# Altium schematic symbol library LATTICEPLDS_Library.SchLib: 291 symbols (part 5 of 32)
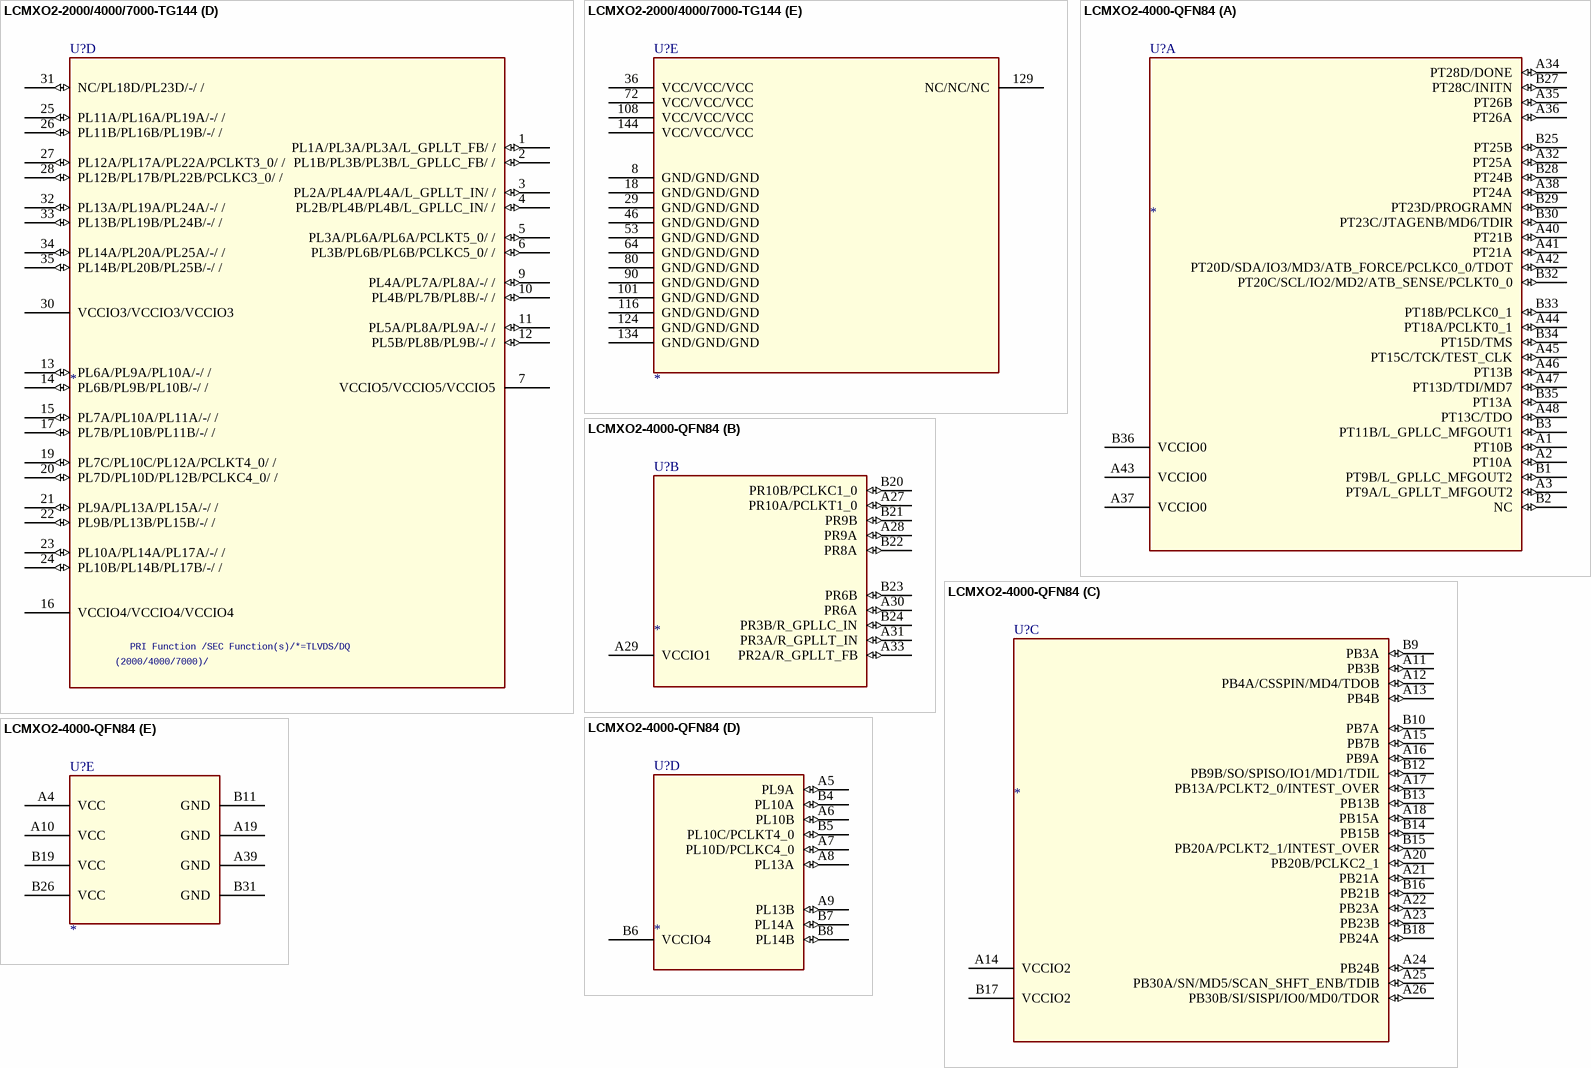
[diagram p307: symbols LCMXO2-2000/4000/7000-TG144 to LCMXO2-4000-QFN84]

## LCMXO2-2000/4000/7000-TG144
designator U?
SPLIT_INST: TRUE; SWAP_INFO: (S1+S2+S3+S4+S5)
part A pins: 109 PT24D/PT28D/PT36D/DONE/ / (io), 110 PT24C/PT28C/PT36C/INITN/ / (io), 111 PT23B/PT27B/PT35B/-/*/ (io), 112 PT23A/PT27A/PT35A/-/*/ (io), 113 PT22B/PT25B/PT33B/-/*/ (io), 114 PT22A/PT25A/PT33A/-/*/ (io), 115 PT21B/PT24B/PT28B/-/*/ (io), 117 PT21A/PT24A/PT28A/-/*/ (io), 118 VCCIO0/VCCIO0/VCCIO0 (power), 119 PT20D/PT23D/PT27D/PROGRAMN/ / (io), 120 PT20C/PT23C/PT27C/JTAGENB;MD6;TDIR/ / (io), 121 PT19B/PT21B/PT25B/-/*/ (io), 122 PT19A/PT21A/PT25A/-/*/ (io), 123 VCCIO0/VCCIO0/VCCIO0 (power), 125 PT18D/PT20D/PT22D/SDA;IO3;MD3;ATB_FORCE;PCLKC0_0;TDOT/ / (io), 126 PT18C/PT20C/PT22C/SCL;IO2;MD2;ATB_SENSE;PCLKT0_0/ / (io), 127 PT17B/PT18B/PT18B/PCLKC0_1/*/ (io), 128 PT17A/PT18A/PT18A/PCLKT0_1/*/ (io), 130 PT16D/PT15D/PT17D/TMS/ / (io), 131 PT16C/PT15C/PT17C/TCK;TEST_CLK/ / (io), 132 PT13B/PT14B/PT15B/-/*/ (io), 133 PT13A/PT14A/PT15A/-/*/ (io), 135 VCCIO0/VCCIO0/VCCIO0 (power), 136 PT12D/PT13D/PT14D/TDI;MD7/ / (io), 137 PT12C/PT13C/PT14C/TDO/ / (io), 138 PT11B/PT11B/PT11B/-/*/ (io), 139 PT11A/PT11A/PT11A/-/*/ (io), 140 PT10B/PT10B/PT10B/-/*/ (io), 141 PT10A/PT10A/PT10A/-/*/ (io), 142 PT9B/PT9B/PT9B/-/*/ (io), 143 PT9A/PT9A/PT9A/-/*/ (io)
part B pins: 73 PR14B/PR19B/PR24B/-/ /DQ1 (io), 74 PR14A/PR19A/PR24A/-/ /DQ1 (io), 75 PR13B/PR18B/PR23B/-/ /DQ1 (io), 76 PR13A/PR18A/PR23A/-/ /DQ1 (io), 77 PR12B/PR16B/PR21B/-/ /DQ1 (io), 78 PR12A/PR16A/PR21A/-/ /DQ1 (io), 79 VCCIO1/VCCIO1/VCCIO1 (power), 81 PR11B/PR15B/PR18B/-/ /DQ1 (io), 82 PR11A/PR15A/PR18A/-/ /DQ1 (io), 83 PR10B/PR14B/PR17B/-/ /DQ1 (io), 84 PR10A/PR14A/PR17A/-/ /DQ1 (io), 85 PR9B/PR13B/PR16B/-/ /DQS1N (io), 86 PR9A/PR13A/PR16A/-/ /DQS1 (io), 87 PR7D/PR10D/PR15B/-/ / (io), 88 VCCIO1/VCCIO1/VCCIO1 (power), 89 PR7C/PR10C/PR15A/-/ / (io), 91 PR7B/PR10B/PR12B/PCLKC1_0/ /DQ0 (io), 92 PR7A/PR10A/PR12A/PCLKT1_0/ /DQ0 (io), 93 PR6B/PR9B/PR11B/-/ /DQS0N (io), 94 PR6A/PR9A/PR11A/-/ /DQS0 (io), 95 PR5B/PR8B/PR9B/-/ /DQ0 (io), 96 PR5A/PR8A/PR9A/-/ /DQ0 (io), 97 PR4B/PR6B/PR7B/-/ /DQ0 (io), 98 PR4A/PR6A/PR7A/-/ /DQ0 (io), 99 PR3B/PR5B/PR5B/-/ /DQ0 (io), 100 PR3A/PR5A/PR5A/-/ /DQ0 (io), 102 VCCIO1/VCCIO1/VCCIO1 (power), 103 NC/PR4C/PR4C/-/ / (io), 104 PR2B/PR3B/PR3B/R_GPLLC_IN/ /DQ0 (io), 105 PR2A/PR3A/PR3A/R_GPLLT_IN/ /DQ0 (io), 106 PR1B/PR2B/PR2B/R_GPLLC_FB/ /DQ0 (io), 107 PR1A/PR2A/PR2A/R_GPLLT_FB/ /DQ0 (io)
part C pins: 37 VCCIO2/VCCIO2/VCCIO2 (power), 38 PB3A/PB3A/PB4A/-/ / (io), 39 PB3B/PB3B/PB4B/-/ / (io), 40 PB5A/PB4A/PB6A/CSSPIN;MD4;TDOB/ / (io), 41 PB5B/PB4B/PB6B/-/ / (io), 42 PB6A/PB7A/PB9A/-/ / (io), 43 PB6B/PB7B/PB9B/-/ / (io), 44 PB8A/PB9A/PB12A/MCLK;CCLK/ / (io), 45 PB8B/PB9B/PB12B/SO;SPISO;IO1;MD1;TDIL/ / (io), 47 PB9A/PB10A/PB13A/-/ / (io), 48 PB9B/PB10B/PB13B/-/ / (io), 49 PB11A/PB13A/PB16A/PCLKT2_0;INTEST_OVER/ / (io), 50 PB11B/PB13B/PB16B/PCLKC2_0/ / (io), 51 VCCIO2/VCCIO2/VCCIO2 (power), 52 PB12A/PB15A/PB18A/-/ / (io), 54 PB12B/PB15B/PB18B/-/ / (io), 55 PB16A/PB20A/PB23A/PCLKT2_1;INTEST_OVER/ / (io), 56 PB16B/PB20B/PB23B/PCLKC2_1/ / (io), 57 PB18A/PB21A/PB26A/-/ / (io), 58 PB18B/PB21B/PB26B/-/ / (io), 59 PB19A/PB23A/PB29A/-/ / (io), 60 PB19B/PB23B/PB29B/-/ / (io), 61 PB21A/PB24A/PB31A/-/ / (io), 62 PB21B/PB24B/PB31B/-/ / (io), 63 NC/PB24D/PB31D/-/ / (io), 65 PB22A/PB27A/PB35A/-/ / (io), 66 VCCIO2/VCCIO2/VCCIO2 (power), 67 PB22B/PB27B/PB35B/-/ / (io), 68 PB24A/PB29A/PB37A/-/ / (io), 69 PB24B/PB29B/PB37B/-/ / (io), 70 PB25A/PB30A/PB38A/SN;MD5;SCAN_SHFT_ENB;TDIB/ / (io), 71 PB25B/PB30B/PB38B/SI;SISPI;IO0;MD0;TDOR/ / (io)
part D pins: 1 PL1A/PL3A/PL3A/L_GPLLT_FB/ / (io), 2 PL1B/PL3B/PL3B/L_GPLLC_FB/ / (io), 3 PL2A/PL4A/PL4A/L_GPLLT_IN/ / (io), 4 PL2B/PL4B/PL4B/L_GPLLC_IN/ / (io), 5 PL3A/PL6A/PL6A/PCLKT5_0/ / (io), 6 PL3B/PL6B/PL6B/PCLKC5_0/ / (io), 7 VCCIO5/VCCIO5/VCCIO5 (power), 9 PL4A/PL7A/PL8A/-/ / (io), 10 PL4B/PL7B/PL8B/-/ / (io), 11 PL5A/PL8A/PL9A/-/ / (io), 12 PL5B/PL8B/PL9B/-/ / (io), 13 PL6A/PL9A/PL10A/-/ / (io), 14 PL6B/PL9B/PL10B/-/ / (io), 15 PL7A/PL10A/PL11A/-/ / (io), 16 VCCIO4/VCCIO4/VCCIO4 (power), 17 PL7B/PL10B/PL11B/-/ / (io), 19 PL7C/PL10C/PL12A/PCLKT4_0/ / (io), 20 PL7D/PL10D/PL12B/PCLKC4_0/ / (io), 21 PL9A/PL13A/PL15A/-/ / (io), 22 PL9B/PL13B/PL15B/-/ / (io), 23 PL10A/PL14A/PL17A/-/ / (io), 24 PL10B/PL14B/PL17B/-/ / (io), 25 PL11A/PL16A/PL19A/-/ / (io), 26 PL11B/PL16B/PL19B/-/ / (io), 27 PL12A/PL17A/PL22A/PCLKT3_0/ / (io), 28 PL12B/PL17B/PL22B/PCLKC3_0/ / (io), 30 VCCIO3/VCCIO3/VCCIO3 (power), 31 NC/PL18D/PL23D/-/ / (io), 32 PL13A/PL19A/PL24A/-/ / (io), 33 PL13B/PL19B/PL24B/-/ / (io), 34 PL14A/PL20A/PL25A/-/ / (io), 35 PL14B/PL20B/PL25B/-/ / (io)
part E pins: 8 GND/GND/GND (power), 18 GND/GND/GND (power), 29 GND/GND/GND (power), 36 VCC/VCC/VCC (power), 46 GND/GND/GND (power), 53 GND/GND/GND (power), 64 GND/GND/GND (power), 72 VCC/VCC/VCC (power), 80 GND/GND/GND (power), 90 GND/GND/GND (power), 101 GND/GND/GND (power), 108 VCC/VCC/VCC (power), 116 GND/GND/GND (power), 124 GND/GND/GND (power), 129 NC/NC/NC, 134 GND/GND/GND (power), 144 VCC/VCC/VCC (power)
part A text: PRI Function /SEC Function(s)/*=TLVDS/DQ; (2000/4000/7000)/
part B text: DQ0; DQ1; PRI Function /SEC Function(s)/*=TLVDS/DQ; (2000/4000/7000)/(No R_GPLL in XO2-2000
part C text: PRI Function /SEC Function(s)/*=TLVDS/DQ; (2000/4000/7000)/
part D text: PRI Function /SEC Function(s)/*=TLVDS/DQ; (2000/4000/7000)/

## LCMXO2-4000-QFN84
designator U?
SWAP_INFO: (S1+S2+S3+S4+S5); SPLIT_INST: TRUE
part A pins: A1 PT10B (io), A2 PT10A (io), A3 PT9A/L_GPLLT_MFGOUT2 (io), A32 PT25A (io), A34 PT28D/DONE (io), A35 PT26B (io), A36 PT26A (io), A37 VCCIO0 (power), A38 PT24A (io), A40 PT21B (io), A41 PT21A (io), A42 PT20D/SDA/IO3/MD3/ATB_FORCE/PCLKC0_0/TDOT (io), A43 VCCIO0 (power), A44 PT18A/PCLKT0_1 (io), A45 PT15C/TCK/TEST_CLK (io), A46 PT13B (io), A47 PT13D/TDI/MD7 (io), A48 PT13C/TDO (io), B1 PT9B/L_GPLLC_MFGOUT2 (io), B2 NC (io), B3 PT11B/L_GPLLC_MFGOUT1 (io), B25 PT25B (io), B27 PT28C/INITN (io), B28 PT24B (io), B29 PT23D/PROGRAMN (io), B30 PT23C/JTAGENB/MD6/TDIR (io), B32 PT20C/SCL/IO2/MD2/ATB_SENSE/PCLKT0_0 (io), B33 PT18B/PCLKC0_1 (io), B34 PT15D/TMS (io), B35 PT13A (io), B36 VCCIO0 (power)
part B pins: A27 PR10A/PCLKT1_0 (io), A28 PR9A (io), A29 VCCIO1 (power), A30 PR6A (io), A31 PR3A/R_GPLLT_IN (io), A33 PR2A/R_GPLLT_FB (io), B20 PR10B/PCLKC1_0 (io), B21 PR9B (io), B22 PR8A (io), B23 PR6B (io), B24 PR3B/R_GPLLC_IN (io)
part C pins: A11 PB3B (io), A12 PB4A/CSSPIN/MD4/TDOB (io), A13 PB4B (io), A14 VCCIO2 (power), A15 PB7B (io), A16 PB9A (io), A17 PB13A/PCLKT2_0/INTEST_OVER (io), A18 PB15A (io), A20 PB20B/PCLKC2_1 (io), A21 PB21A (io), A22 PB23A (io), A23 PB23B (io), A24 PB24B (io), A25 PB30A/SN/MD5/SCAN_SHFT_ENB/TDIB (io), A26 PB30B/SI/SISPI/IO0/MD0/TDOR (io), B9 PB3A (io), B10 PB7A (io), B12 PB9B/SO/SPISO/IO1/MD1/TDIL (io), B13 PB13B (io), B14 PB15B (io), B15 PB20A/PCLKT2_1/INTEST_OVER (io), B16 PB21B (io), B17 VCCIO2 (power), B18 PB24A (io)
part D pins: A5 PL9A (io), A6 PL10B (io), A7 PL10D/PCLKC4_0 (io), A8 PL13A (io), A9 PL13B (io), B4 PL10A (io), B5 PL10C/PCLKT4_0 (io), B6 VCCIO4 (power), B7 PL14A (io), B8 PL14B (io)
part E pins: A4 VCC (power), A10 VCC (power), A19 GND (power), A39 GND (power), B11 GND (power), B19 VCC (power), B26 VCC (power), B31 GND (power)

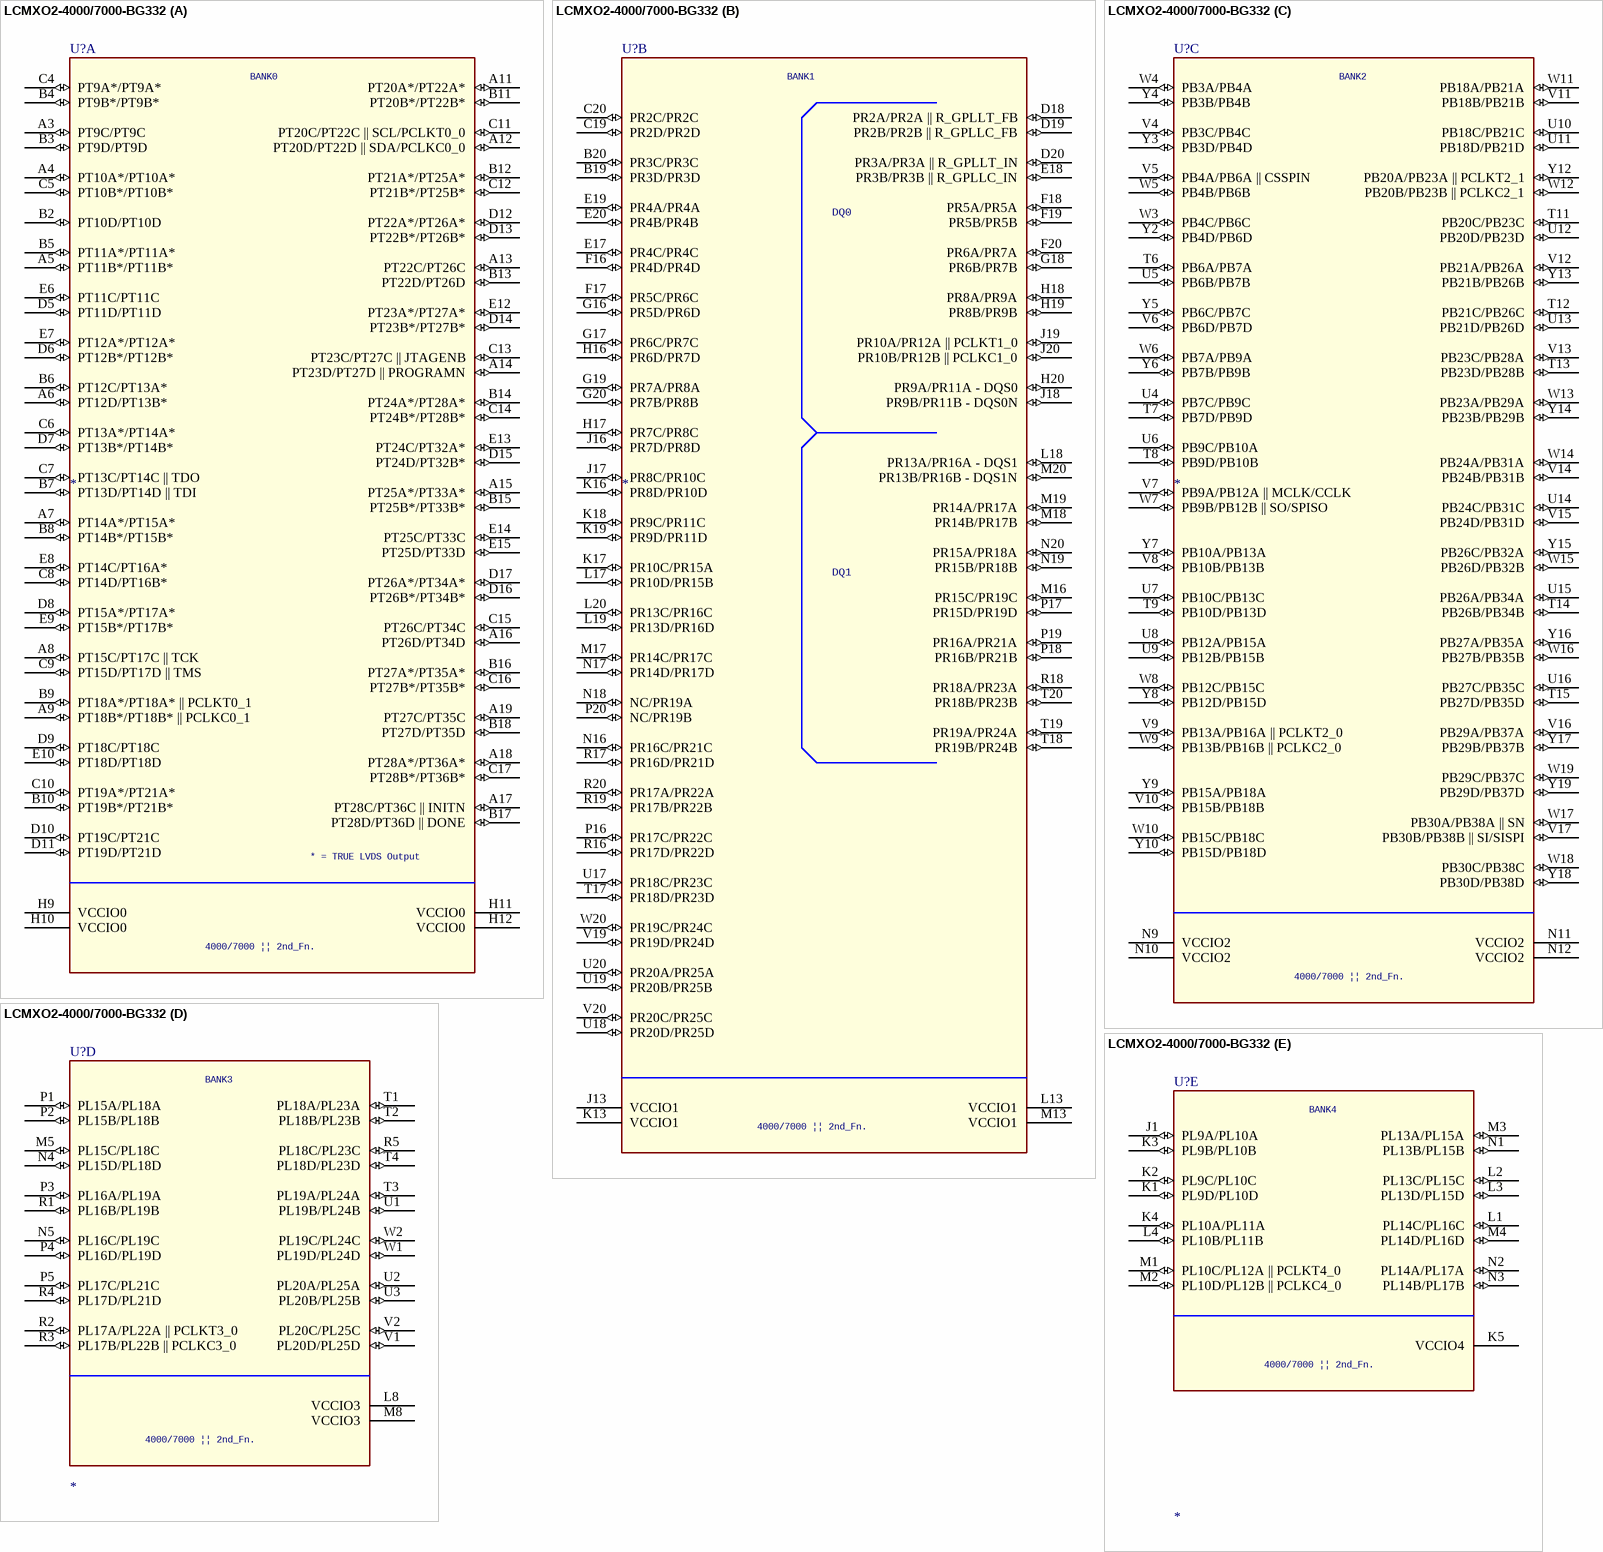
[diagram p46: symbol LCMXO2-4000/7000-BG332]

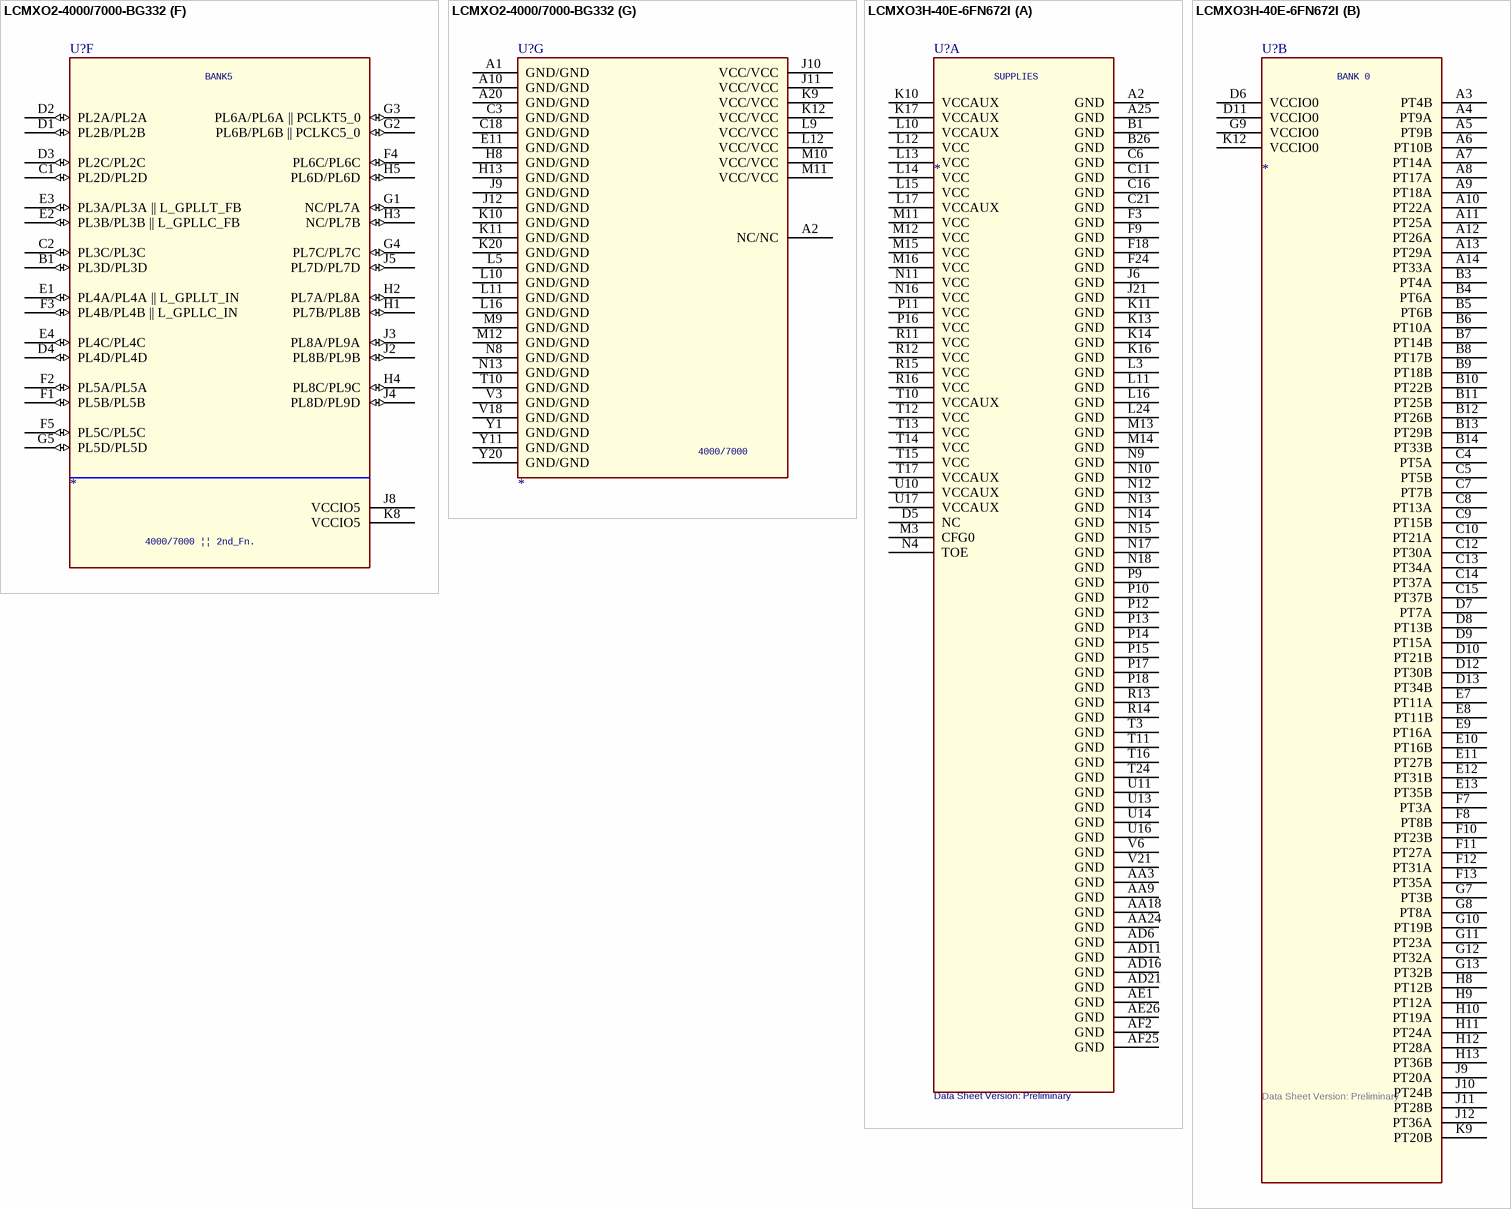
[diagram p47: symbols LCMXO2-4000/7000-BG332 to LCMXO3H-40E-6FN672I]

## LCMXO2-4000/7000-BG332
designator U?
SWAP_INFO: (S1+S2+S3+S4+S5+S6+S7); SPLIT_INST: TRUE
part A pins: A3 PT9C/PT9C (io), A4 PT10A*/PT10A* (io), A5 PT11B*/PT11B* (io), A6 PT12D/PT13B* (io), A7 PT14A*/PT15A* (io), A8 PT15C/PT17C || TCK (io), A9 PT18B*/PT18B* || PCLKC0_1 (io), A11 PT20A*/PT22A* (io), A12 PT20D/PT22D || SDA/PCLKC0_0 (io), A13 PT22C/PT26C (io), A14 PT23D/PT27D || PROGRAMN (io), A15 PT25A*/PT33A* (io), A16 PT26D/PT34D (io), A17 PT28C/PT36C || INITN (io), A18 PT28A*/PT36A* (io), A19 PT27C/PT35C (io), B2 PT10D/PT10D (io), B3 PT9D/PT9D (io), B4 PT9B*/PT9B* (io), B5 PT11A*/PT11A* (io), B6 PT12C/PT13A* (io), B7 PT13D/PT14D || TDI (io), B8 PT14B*/PT15B* (io), B9 PT18A*/PT18A* || PCLKT0_1 (io), B10 PT19B*/PT21B* (io), B11 PT20B*/PT22B* (io), B12 PT21A*/PT25A* (io), B13 PT22D/PT26D (io), B14 PT24A*/PT28A* (io), B15 PT25B*/PT33B* (io), B16 PT27A*/PT35A* (io), B17 PT28D/PT36D || DONE (io), B18 PT27D/PT35D (io), C4 PT9A*/PT9A* (io), C5 PT10B*/PT10B* (io), C6 PT13A*/PT14A* (io), C7 PT13C/PT14C || TDO (io), C8 PT14D/PT16B* (io), C9 PT15D/PT17D || TMS (io), C10 PT19A*/PT21A* (io), C11 PT20C/PT22C || SCL/PCLKT0_0 (io), C12 PT21B*/PT25B* (io), C13 PT23C/PT27C || JTAGENB (io), C14 PT24B*/PT28B* (io), C15 PT26C/PT34C (io), C16 PT27B*/PT35B* (io), C17 PT28B*/PT36B* (io), D5 PT11D/PT11D (io), D6 PT12B*/PT12B* (io), D7 PT13B*/PT14B* (io), D8 PT15A*/PT17A* (io), D9 PT18C/PT18C (io), D10 PT19C/PT21C (io), D11 PT19D/PT21D (io), D12 PT22A*/PT26A* (io), D13 PT22B*/PT26B* (io), D14 PT23B*/PT27B* (io), D15 PT24D/PT32B* (io), D16 PT26B*/PT34B* (io), D17 PT26A*/PT34A* (io), E6 PT11C/PT11C (io), E7 PT12A*/PT12A* (io), E8 PT14C/PT16A* (io), E9 PT15B*/PT17B* (io), E10 PT18D/PT18D (io), E12 PT23A*/PT27A* (io), E13 PT24C/PT32A* (io), E14 PT25C/PT33C (io), E15 PT25D/PT33D (io), H9 VCCIO0 (power), H10 VCCIO0 (power), H11 VCCIO0 (power), H12 VCCIO0 (power)
part B pins: B19 PR3D/PR3D (io), B20 PR3C/PR3C (io), C19 PR2D/PR2D (io), C20 PR2C/PR2C (io), D18 PR2A/PR2A || R_GPLLT_FB (io), D19 PR2B/PR2B || R_GPLLC_FB (io), D20 PR3A/PR3A || R_GPLLT_IN (io), E17 PR4C/PR4C (io), E18 PR3B/PR3B || R_GPLLC_IN (io), E19 PR4A/PR4A (io), E20 PR4B/PR4B (io), F16 PR4D/PR4D (io), F17 PR5C/PR6C (io), F18 PR5A/PR5A (io), F19 PR5B/PR5B (io), F20 PR6A/PR7A (io), G16 PR5D/PR6D (io), G17 PR6C/PR7C (io), G18 PR6B/PR7B (io), G19 PR7A/PR8A (io), G20 PR7B/PR8B (io), H16 PR6D/PR7D (io), H17 PR7C/PR8C (io), H18 PR8A/PR9A (io), H19 PR8B/PR9B (io), H20 PR9A/PR11A - DQS0 (io), J13 VCCIO1 (power), J16 PR7D/PR8D (io), J17 PR8C/PR10C (io), J18 PR9B/PR11B - DQS0N (io), J19 PR10A/PR12A || PCLKT1_0 (io), J20 PR10B/PR12B || PCLKC1_0 (io), K13 VCCIO1 (power), K16 PR8D/PR10D (io), K17 PR10C/PR15A (io), K18 PR9C/PR11C (io), K19 PR9D/PR11D (io), L13 VCCIO1 (power), L17 PR10D/PR15B (io), L18 PR13A/PR16A - DQS1 (io), L19 PR13D/PR16D (io), L20 PR13C/PR16C (io), M13 VCCIO1 (power), M16 PR15C/PR19C (io), M17 PR14C/PR17C (io), M18 PR14B/PR17B (io), M19 PR14A/PR17A (io), M20 PR13B/PR16B - DQS1N (io), N16 PR16C/PR21C (io), N17 PR14D/PR17D (io), N18 NC/PR19A (io), N19 PR15B/PR18B (io), N20 PR15A/PR18A (io), P16 PR17C/PR22C (io), P17 PR15D/PR19D (io), P18 PR16B/PR21B (io), P19 PR16A/PR21A (io), P20 NC/PR19B (io), R16 PR17D/PR22D (io), R17 PR16D/PR21D (io), R18 PR18A/PR23A (io), R19 PR17B/PR22B (io), R20 PR17A/PR22A (io), T17 PR18D/PR23D (io), T18 PR19B/PR24B (io), T19 PR19A/PR24A (io), T20 PR18B/PR23B (io), U17 PR18C/PR23C (io), U18 PR20D/PR25D (io), U19 PR20B/PR25B (io), U20 PR20A/PR25A (io), V19 PR19D/PR24D (io), V20 PR20C/PR25C (io), W20 PR19C/PR24C (io)
part C pins: N9 VCCIO2 (power), N10 VCCIO2 (power), N11 VCCIO2 (power), N12 VCCIO2 (power), T6 PB6A/PB7A (io), T7 PB7D/PB9D (io), T8 PB9D/PB10B (io), T9 PB10D/PB13D (io), T11 PB20C/PB23C (io), T12 PB21C/PB26C (io), T13 PB23D/PB28B (io), T14 PB26B/PB34B (io), T15 PB27D/PB35D (io), U4 PB7C/PB9C (io), U5 PB6B/PB7B (io), U6 PB9C/PB10A (io), U7 PB10C/PB13C (io), U8 PB12A/PB15A (io), U9 PB12B/PB15B (io), U10 PB18C/PB21C (io), U11 PB18D/PB21D (io), U12 PB20D/PB23D (io), U13 PB21D/PB26D (io), U14 PB24C/PB31C (io), U15 PB26A/PB34A (io), U16 PB27C/PB35C (io), V4 PB3C/PB4C (io), V5 PB4A/PB6A || CSSPIN (io), V6 PB6D/PB7D (io), V7 PB9A/PB12A || MCLK/CCLK (io), V8 PB10B/PB13B (io), V9 PB13A/PB16A || PCLKT2_0 (io), V10 PB15B/PB18B (io), V11 PB18B/PB21B (io), V12 PB21A/PB26A (io), V13 PB23C/PB28A (io), V14 PB24B/PB31B (io), V15 PB24D/PB31D (io), V16 PB29A/PB37A (io), V17 PB30B/PB38B || SI/SISPI (io), W3 PB4C/PB6C (io), W4 PB3A/PB4A (io), W5 PB4B/PB6B (io), W6 PB7A/PB9A (io), W7 PB9B/PB12B || SO/SPISO (io), W8 PB12C/PB15C (io), W9 PB13B/PB16B || PCLKC2_0 (io), W10 PB15C/PB18C (io), W11 PB18A/PB21A (io), W12 PB20B/PB23B || PCLKC2_1 (io), W13 PB23A/PB29A (io), W14 PB24A/PB31A (io), W15 PB26D/PB32B (io), W16 PB27B/PB35B (io), W17 PB30A/PB38A || SN (io), W18 PB30C/PB38C (io), W19 PB29C/PB37C (io), Y2 PB4D/PB6D (io), Y3 PB3D/PB4D (io), Y4 PB3B/PB4B (io), Y5 PB6C/PB7C (io), Y6 PB7B/PB9B (io), Y7 PB10A/PB13A (io), Y8 PB12D/PB15D (io), Y9 PB15A/PB18A (io), Y10 PB15D/PB18D (io), Y12 PB20A/PB23A || PCLKT2_1 (io), Y13 PB21B/PB26B (io), Y14 PB23B/PB29B (io), Y15 PB26C/PB32A (io), Y16 PB27A/PB35A (io), Y17 PB29B/PB37B (io), Y18 PB30D/PB38D (io), Y19 PB29D/PB37D (io)
part D pins: L8 VCCIO3 (power), M5 PL15C/PL18C (io), M8 VCCIO3 (power), N4 PL15D/PL18D (io), N5 PL16C/PL19C (io), P1 PL15A/PL18A (io), P2 PL15B/PL18B (io), P3 PL16A/PL19A (io), P4 PL16D/PL19D (io), P5 PL17C/PL21C (io), R1 PL16B/PL19B (io), R2 PL17A/PL22A || PCLKT3_0 (io), R3 PL17B/PL22B || PCLKC3_0 (io), R4 PL17D/PL21D (io), R5 PL18C/PL23C (io), T1 PL18A/PL23A (io), T2 PL18B/PL23B (io), T3 PL19A/PL24A (io), T4 PL18D/PL23D (io), U1 PL19B/PL24B (io), U2 PL20A/PL25A (io), U3 PL20B/PL25B (io), V1 PL20D/PL25D (io), V2 PL20C/PL25C (io), W1 PL19D/PL24D (io), W2 PL19C/PL24C (io)
part E pins: J1 PL9A/PL10A (io), K1 PL9D/PL10D (io), K2 PL9C/PL10C (io), K3 PL9B/PL10B (io), K4 PL10A/PL11A (io), K5 VCCIO4 (power), L1 PL14C/PL16C (io), L2 PL13C/PL15C (io), L3 PL13D/PL15D (io), L4 PL10B/PL11B (io), M1 PL10C/PL12A || PCLKT4_0 (io), M2 PL10D/PL12B || PCLKC4_0 (io), M3 PL13A/PL15A (io), M4 PL14D/PL16D (io), N1 PL13B/PL15B (io), N2 PL14A/PL17A (io), N3 PL14B/PL17B (io)
part F pins: B1 PL3D/PL3D (io), C1 PL2D/PL2D (io), C2 PL3C/PL3C (io), D1 PL2B/PL2B (io), D2 PL2A/PL2A (io), D3 PL2C/PL2C (io), D4 PL4D/PL4D (io), E1 PL4A/PL4A || L_GPLLT_IN (io), E2 PL3B/PL3B || L_GPLLC_FB (io), E3 PL3A/PL3A || L_GPLLT_FB (io), E4 PL4C/PL4C (io), F1 PL5B/PL5B (io), F2 PL5A/PL5A (io), F3 PL4B/PL4B || L_GPLLC_IN (io), F4 PL6C/PL6C (io), F5 PL5C/PL5C (io), G1 NC/PL7A (io), G2 PL6B/PL6B || PCLKC5_0 (io), G3 PL6A/PL6A || PCLKT5_0 (io), G4 PL7C/PL7C (io), G5 PL5D/PL5D (io), H1 PL7B/PL8B (io), H2 PL7A/PL8A (io), H3 NC/PL7B (io), H4 PL8C/PL9C (io), H5 PL6D/PL6D (io), J2 PL8B/PL9B (io), J3 PL8A/PL9A (io), J4 PL8D/PL9D (io), J5 PL7D/PL7D (io), J8 VCCIO5 (power), K8 VCCIO5 (power)
part G pins: A1 GND/GND (power), A2 NC/NC, A10 GND/GND (power), A20 GND/GND (power), C3 GND/GND (power), C18 GND/GND (power), E11 GND/GND (power), H8 GND/GND (power), H13 GND/GND (power), J9 GND/GND (power), J10 VCC/VCC (power), J11 VCC/VCC (power), J12 GND/GND (power), K9 VCC/VCC (power), K10 GND/GND (power), K11 GND/GND (power), K12 VCC/VCC (power), K20 GND/GND (power), L5 GND/GND (power), L9 VCC/VCC (power), L10 GND/GND (power), L11 GND/GND (power), L12 VCC/VCC (power), L16 GND/GND (power), M9 GND/GND (power), M10 VCC/VCC (power), M11 VCC/VCC (power), M12 GND/GND (power), N8 GND/GND (power), N13 GND/GND (power), T10 GND/GND (power), V3 GND/GND (power), V18 GND/GND (power), Y1 GND/GND (power), Y11 GND/GND (power), Y20 GND/GND (power)

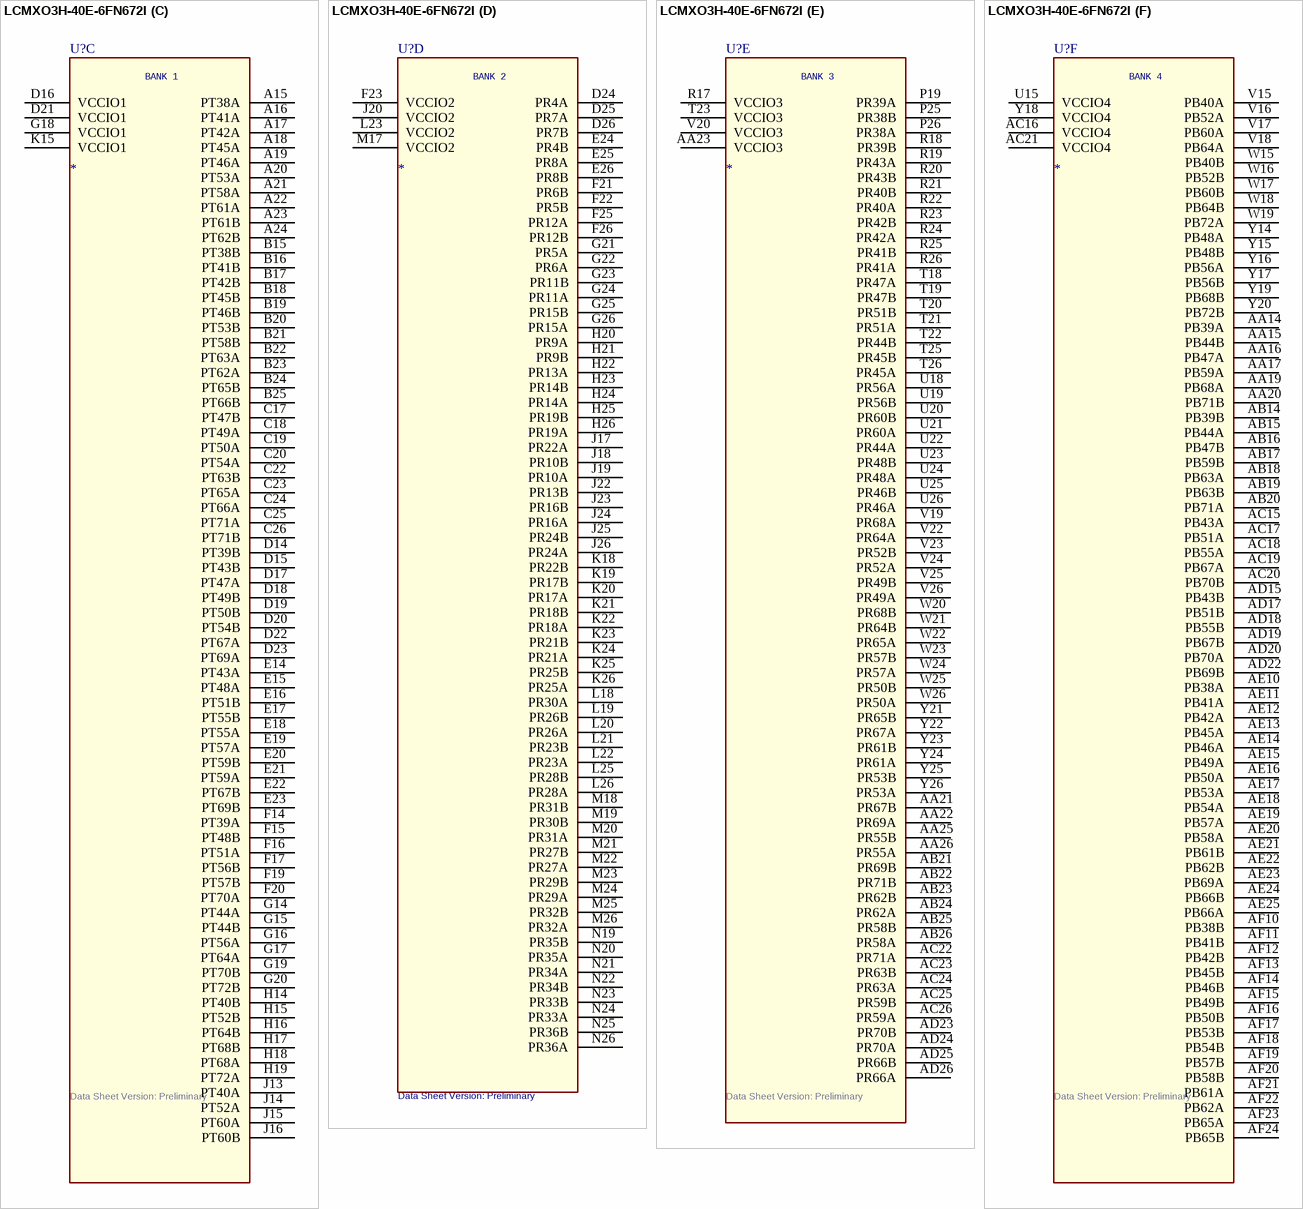
[diagram p48: symbol LCMXO3H-40E-6FN672I]
